# Altium footprint library 全库.PcbLib: 967 footprints (part 22 of 61)
Each footprint in its own frame and in the unit in brackets; x right, y up, seen from the top. Pads: shape width x height; smd on the part's side, far side on the other; paste and mask are expansions set on the pad; w line width, h text height; cw(c..) or ccw(c..) is an arc to the next point about the centre after c.
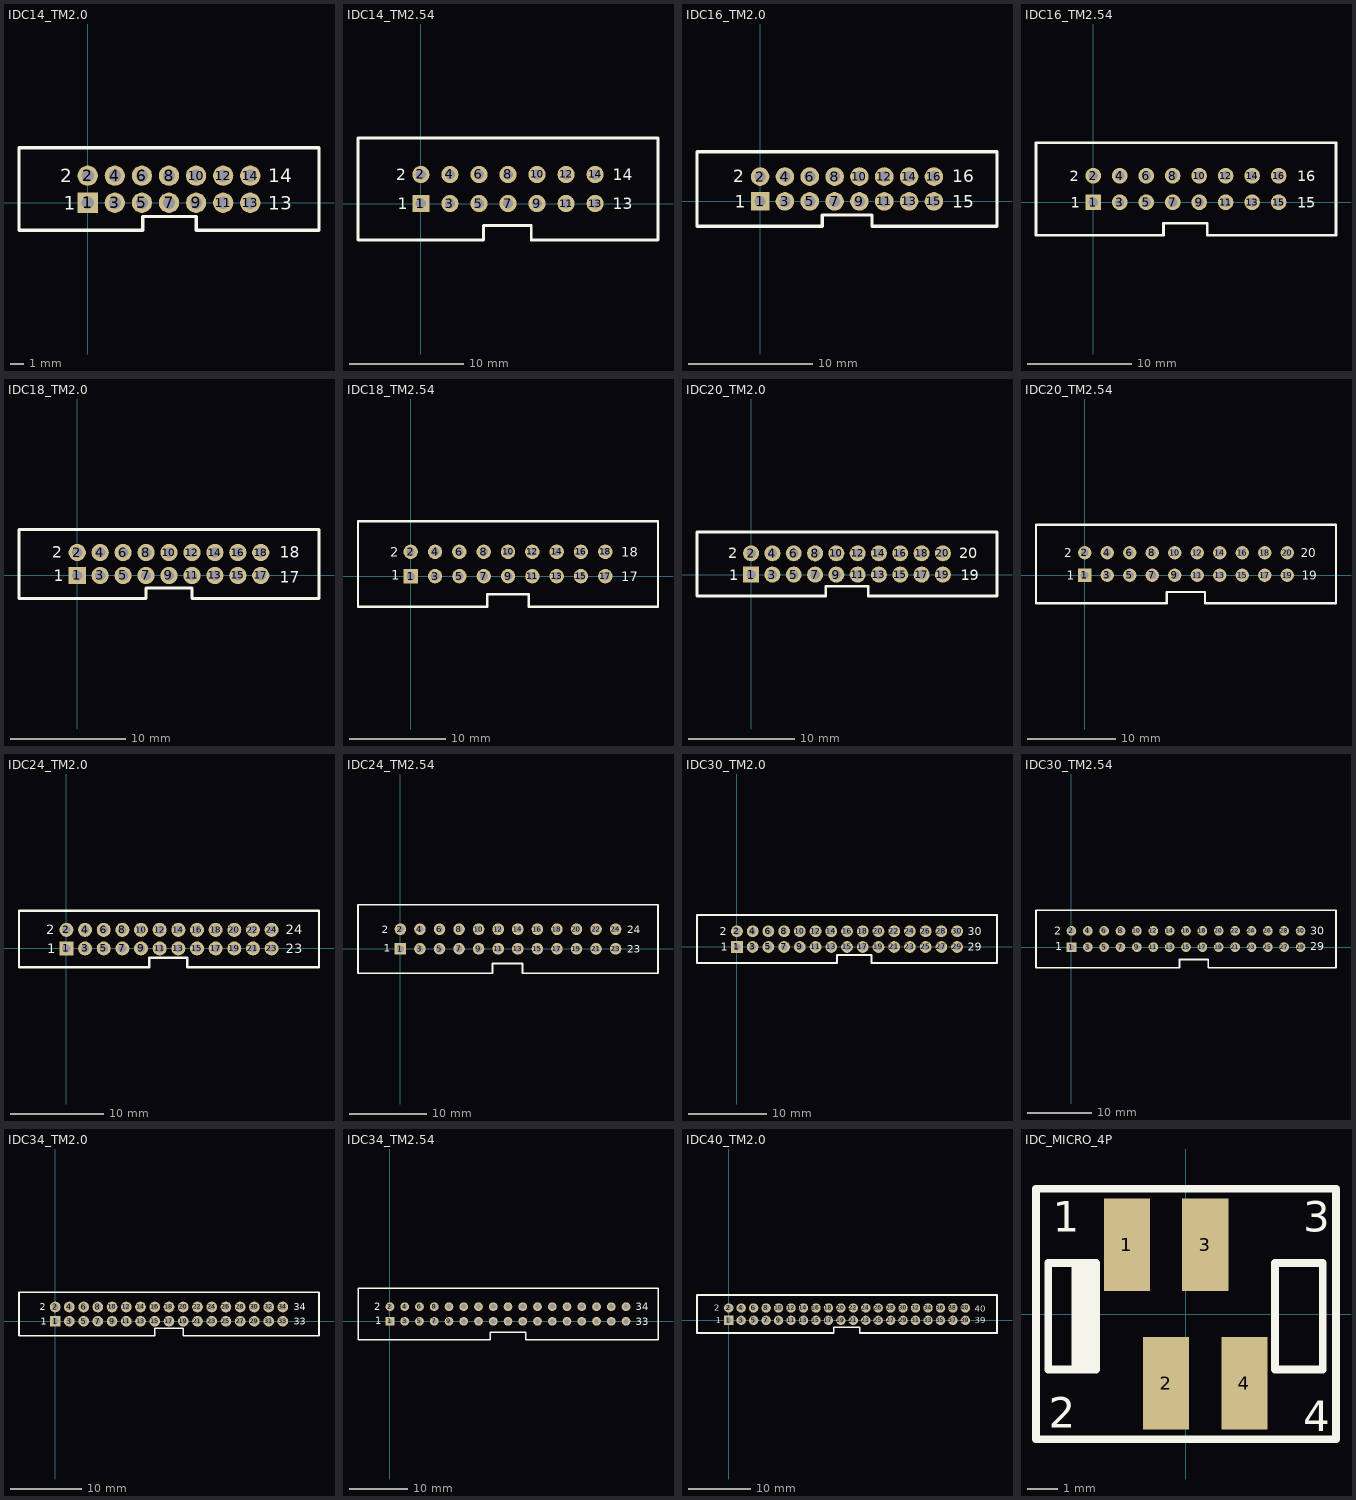
[diagram p21: the footprints below, top view; thin cyan lines are the x and y axes]

## IDC14_TM2.0 [mm]
pads (14):
  rect 1.5x1.5 hole 0.9: 1(0,0)
  round 1.5 hole 0.9: 2(0,2) 3(2,0) 4(2,2) 5(4,0) 6(4,2) 7(6,0) 8(6,2) 9(8,0) 10(8,2) 11(10,0) 12(10,2) 13(12,0) 14(12,2)
Top Overlay:
  lines w0.254: -5.08,-2.032 4.064,-2.032 4.064,-1.016 8.001,-1.016 8.001,-2.032 17.08,-2.032 17.08,4.064 -5.08,4.064 -5.08,-2.032
  text "1" at -1.778,-0.508 h1
  text "2" at -2.032,1.524 h1
  text "13" at 13.335,-0.508 h1
  text "14" at 13.335,1.524 h1

## IDC14_TM2.54 [mm] "Connector; Header; 7x2 Position"
pads (14):
  rect 1.5x1.5 hole 0.9: 1(0,0)
  round 1.5 hole 0.9: 2(0,2.54) 3(2.54,0) 4(2.54,2.54) 5(5.08,0) 6(5.08,2.54) 7(7.62,0) 8(7.62,2.54) 9(10.16,0) 10(10.16,2.54) 11(12.7,0) 12(12.7,2.54) 13(15.24,0) 14(15.24,2.54)
Top Overlay:
  lines w0.254: -5.5,-3.175 5.461,-3.175 5.461,-1.905 9.652,-1.905 9.652,-3.175 20.74,-3.175 20.74,5.715 -5.5,5.715 -5.5,-3.175
  text "1" at -2.032,-0.508 h1
  text "2" at -2.159,2.032 h1
  text "13" at 16.764,-0.508 h1
  text "14" at 16.764,2.032 h1

## IDC16_TM2.0 [mm]
pads (16):
  rect 1.5x1.5 hole 0.9: 1(0,0)
  round 1.5 hole 0.9: 2(0,2) 3(2,0) 4(2,2) 5(4,0) 6(4,2) 7(6,0) 8(6.006,1.997) 9(8,0) 10(8,2) 11(10,0) 12(10,2) 13(12,0) 14(12,2) 15(14,0) 16(14,2)
Top Overlay:
  lines w0.254: -5.08,-2.003 5.006,-2.003 5.006,-1.103 9.006,-1.103 9.006,-2.003 19.08,-2.003 19.08,3.997 -5.08,3.997 -5.08,-2.003
  text "1" at -2.032,-0.508 h1
  text "2" at -2.159,1.524 h1
  text "15" at 15.494,-0.508 h1
  text "16" at 15.494,1.524 h1

## IDC16_TM2.54 [mm]
pads (16):
  rect 1.5x1.5 hole 0.9: 1(0,0)
  round 1.5 hole 0.9: 2(-0.007,2.541) 3(2.54,0) 4(2.533,2.541) 5(5.08,0) 6(5.073,2.541) 7(7.62,0) 8(7.613,2.541) 9(10.153,0.001) 10(10.153,2.541) 11(12.693,0.001) 12(12.693,2.541) 13(15.233,0.001) 14(15.233,2.541) 15(17.773,0.001) 16(17.78,2.54)
Top Overlay:
  lines w0.254: -5.5,-3.175 -5.5,5.715 23.28,5.715 23.28,-3.175 10.922,-3.175 10.922,-2.032 6.731,-2.032 6.731,-3.175 -5.5,-3.175
  text "16" at 19.558,2.032 h1
  text "15" at 19.558,-0.508 h1
  text "2" at -2.286,2.032 h1
  text "1" at -2.159,-0.508 h1

## IDC18_TM2.0 [mm]
pads (18):
  rect 1.5x1.5 hole 0.9: 1(0,0)
  round 1.5 hole 0.9: 2(0,2) 3(2,0) 4(2,2) 5(4,0) 6(4,2) 7(6,0) 8(6.006,1.997) 9(8,0) 10(8,2) 11(10,0) 12(10,2) 13(12,0) 14(12,2) 15(14,0) 16(14,2) 17(16,0) 18(16,2)
Top Overlay:
  lines w0.254: -5.08,-2.003 6,-2.003 6,-1.103 10,-1.103 10,-2.003 21.08,-2.003 21.08,3.997 -5.08,3.997 -5.08,-2.003
  text "1" at -2.032,-0.508 h1
  text "2" at -2.159,1.524 h1
  text "18" at 17.653,1.524 h1
  text "17" at 17.653,-0.635 h1

## IDC18_TM2.54 [mm]
pads (18):
  rect 1.5x1.5 hole 0.9: 1(0,0)
  round 1.5 hole 0.9: 2(0,2.54) 3(2.54,0) 4(2.54,2.54) 5(5.087,-0.001) 6(5.08,2.54) 7(7.627,-0.001) 8(7.62,2.54) 9(10.167,-0.001) 10(10.16,2.54) 11(12.707,-0.001) 12(12.7,2.54) 13(15.24,0) 14(15.24,2.54) 15(17.78,0) 16(17.78,2.54) 17(20.32,0) 18(20.32,2.54)
Top Overlay:
  lines w0.254: -5.5,-3.175 8.001,-3.175 8.001,-1.905 12.319,-1.905 12.319,-3.175 25.82,-3.175 25.82,5.715 -5.5,5.715 -5.5,-3.175
  text "1" at -2.032,-0.381 h1
  text "2" at -2.159,2.032 h1
  text "18" at 21.971,2.032 h1
  text "17" at 21.971,-0.508 h1

## IDC20_TM2.0 [mm]
pads (20):
  rect 1.5x1.5 hole 0.9: 1(0,0)
  round 1.5 hole 0.9: 2(0,2) 3(2,0) 4(2,2) 5(4,0) 6(4,2) 7(6,0) 8(6.006,1.997) 9(8,0) 10(8,2) 11(10,0) 12(10,2) 13(12,0) 14(12,2) 15(14,0) 16(14,2) 17(16,0) 18(16,2) 19(18,0) 20(18,2)
Top Overlay:
  lines w0.254: 6.906,-2.003 -5.08,-2.003 -5.08,3.997 23.08,3.997 23.08,-2.003 11.006,-2.003 11.006,-1.103 7.006,-1.103 7.006,-2.003
  text "19" at 19.685,-0.508 h1
  text "20" at 19.558,1.524 h1
  text "2" at -2.159,1.524 h1
  text "1" at -2.032,-0.508 h1

## IDC20_TM2.54 [mm]
pads (20):
  rect 1.5x1.5 hole 0.9: 1(0,0)
  round 1.5 hole 0.9: 2(0,2.54) 3(2.54,0) 4(2.54,2.54) 5(5.087,-0.001) 6(5.08,2.54) 7(7.627,-0.001) 8(7.62,2.54) 9(10.167,-0.001) 10(10.16,2.54) 11(12.707,-0.001) 12(12.7,2.54) 13(15.24,0) 14(15.24,2.54) 15(17.78,0) 16(17.78,2.54) 17(20.32,0) 18(20.32,2.54) 19(22.86,0) 20(22.867,2.539)
Top Overlay:
  lines w0.254: -5.5,-3.175 9.271,-3.175 9.271,-1.905 13.589,-1.905 13.589,-3.175 28.367,-3.175 28.367,5.714 -5.5,5.714 -5.5,-3.175
  text "1" at -2.032,-0.508 h1
  text "2" at -2.286,2.032 h1
  text "20" at 24.384,2.032 h1
  text "19" at 24.511,-0.508 h1

## IDC24_TM2.0 [mm]
pads (24):
  rect 1.5x1.5 hole 0.9: 1(0,0)
  round 1.5 hole 0.9: 2(0,2) 3(2,0) 4(2,2) 5(4,0) 6(4,2) 7(6,0) 8(6,2) 9(8,0) 10(8,2) 11(10,0) 12(10,2) 13(12,0) 14(12,2) 15(14,0) 16(14,2) 17(16,0) 18(16,2) 19(18,0) 20(18,2) 21(20,0) 22(20,2) 23(22,0) 24(22,2)
Top Overlay:
  lines w0.254: -5.08,-2.032 -5.08,4.064 27.08,4.064 27.08,-2.032 12.954,-2.032 12.954,-0.992 8.89,-0.992 8.89,-2.032 -5.08,-2.032
  text "1" at -2.032,-0.508 h1
  text "2" at -2.159,1.524 h1
  text "23" at 23.495,-0.508 h1
  text "24" at 23.495,1.524 h1

## IDC24_TM2.54 [mm]
pads (24):
  rect 1.5x1.5 hole 0.9: 1(0,0)
  round 1.5 hole 0.9: 2(0,2.54) 3(2.54,0) 4(2.54,2.54) 5(5.08,0) 6(5.08,2.54) 7(7.62,0) 8(7.62,2.54) 9(10.16,0) 10(10.16,2.54) 11(12.7,0) 12(12.7,2.54) 13(15.24,0) 14(15.24,2.54) 15(17.78,0) 16(17.78,2.54) 17(20.32,0) 18(20.32,2.54) 19(22.86,0) 20(22.86,2.54) 21(25.4,0) 22(25.4,2.54) 23(27.94,0) 24(27.94,2.54)
Top Overlay:
  lines w0.254: -5.5,-3.175 11.938,-3.175 11.938,-1.905 15.875,-1.905 15.875,-3.175 33.44,-3.175 33.44,5.715 -5.5,5.715 -5.5,-3.175
  text "24" at 29.464,2.032 h1
  text "23" at 29.464,-0.508 h1
  text "2" at -2.413,2.032 h1
  text "1" at -2.159,-0.381 h1

## IDC30_TM2.0 [mm]
pads (30):
  rect 1.5x1.5 hole 0.9: 1(0,0)
  round 1.5 hole 0.9: 2(0,2) 3(2,0) 4(2,2) 5(4,0) 6(4,2) 7(6,0) 8(6,2) 9(8,0) 10(8,2) 11(10,0) 12(10,2) 13(12,0) 14(12,2) 15(14,0) 16(14,2) 17(16,0) 18(16,2) 19(18,0) 20(18,2) 21(20,0) 22(20,2) 23(22,0) 24(22,2) 25(24,0) 26(24,2) 27(26,0) 28(26,2) 29(28,0) 30(28,2)
Top Overlay:
  lines w0.254: -5.08,-2.032 12.7,-2.032 12.7,-0.992 17.145,-0.992 17.145,-2.032 33.08,-2.032 33.08,4.064 -5.08,4.064 -5.08,-2.032
  text "30" at 29.337,1.524 h1
  text "29" at 29.337,-0.508 h1
  text "2" at -2.159,1.524 h1
  text "1" at -2.032,-0.508 h1

## IDC30_TM2.54 [mm]
pads (30):
  rect 1.5x1.5 hole 0.9: 1(0,0)
  round 1.5 hole 0.9: 2(0,2.54) 3(2.54,0) 4(2.54,2.54) 5(5.08,0) 6(5.08,2.54) 7(7.62,0) 8(7.62,2.54) 9(10.16,0) 10(10.16,2.54) 11(12.7,0) 12(12.7,2.54) 13(15.24,0) 14(15.24,2.54) 15(17.78,0) 16(17.78,2.54) 17(20.32,0) 18(20.32,2.54) 19(22.86,0) 20(22.86,2.54) 21(25.4,0) 22(25.4,2.54) 23(27.94,0) 24(27.94,2.54) 25(30.48,0) 26(30.48,2.54) 27(33.02,0) 28(33.02,2.54) 29(35.56,0) 30(35.56,2.54)
Top Overlay:
  lines w0.254: -5.5,-3.175 16.764,-3.175 16.764,-1.905 21.209,-1.905 21.209,-3.175 41.06,-3.175 41.06,5.715 -5.5,5.715 -5.5,-3.175
  text "1" at -2.54,-0.508 h1.24
  text "2" at -2.667,1.905 h1.24
  text "29" at 37.084,-0.508 h1.24
  text "30" at 37.084,1.905 h1.24

## IDC34_TM2.0 [mm]
pads (34):
  rect 1.5x1.5 hole 0.9: 1(0,0)
  round 1.5 hole 0.9: 2(0,2) 3(2,0) 4(2,2) 5(4,0) 6(4,2) 7(6,0) 8(6,2) 9(8,0) 10(8,2) 11(10,0) 12(10,2) 13(12,0) 14(12,2) 15(14,0) 16(14,2) 17(16,0) 18(16,2) 19(18,0) 20(18,2) 21(20,0) 22(20,2) 23(22,0) 24(22,2) 25(24,0) 26(24,2) 27(26,0) 28(26,2) 29(28,0) 30(28,2) 31(30,0) 32(30,2) 33(32,0) 34(32,2)
Top Overlay:
  lines w0.254: -5.08,-2.032 13.991,-2.032 13.991,-0.992 17.991,-0.992 17.991,-2.032 37.08,-2.032 37.08,4.064 -5.08,4.064 -5.08,-2.032
  text "34" at 33.528,1.524 h1
  text "33" at 33.528,-0.508 h1
  text "2" at -2.159,1.524 h1
  text "1" at -2.032,-0.508 h1

## IDC34_TM2.54 [mm]
pads (34):
  rect 1.5x1.5 hole 0.9: 1(0,0)
  round 1.5 hole 0.9: 2(0,2.54) 3(2.54,0) 4(2.54,2.54) 5(5.08,0) 6(5.08,2.54) 7(7.62,0) 8(7.62,2.54) 9(10.16,0) 10(10.16,2.54) 11(12.7,0) 12(12.7,2.54) 13(15.24,0) 14(15.24,2.54) 15(17.78,0) 16(17.78,2.54) 17(20.32,0) 18(20.32,2.54) 19(22.86,0) 20(22.86,2.54) 21(25.4,0) 22(25.4,2.54) 23(27.94,0) 24(27.94,2.54) 25(30.48,0) 26(30.48,2.54) 27(33.02,0) 28(33.02,2.54) 29(35.56,0) 30(35.56,2.54) 31(38.1,0) 32(38.1,2.54) 33(40.64,0) 34(40.64,2.54)
Top Overlay:
  lines w0.254: -5.5,-3.175 17.272,-3.175 17.272,-1.905 23.368,-1.905 23.368,-3.175 46.14,-3.175 46.14,5.715 -5.5,5.715 -5.5,-3.175
  text "1" at -2.54,-0.508 h1.24
  text "2" at -2.667,1.905 h1.24
  text "33" at 42.291,-0.635 h1.24
  text "34" at 42.291,1.905 h1.24

## IDC40_TM2.0 [mm]
pads (40):
  rect 1.5x1.5 hole 0.9: 1(0,0)
  round 1.5 hole 0.9: 2(0,2) 3(2,0) 4(2,2) 5(4,0) 6(4,2) 7(6,0) 8(6,2) 9(8,0) 10(8,2) 11(10,0) 12(10,2) 13(12,0) 14(12,2) 15(14,0) 16(14,2) 17(16,0) 18(16,2) 19(18,0) 20(18,2) 21(20,0) 22(20,2) 23(22,0) 24(22,2) 25(24,0) 26(24,2) 27(26,0) 28(26,2) 29(28,0) 30(28,2) 31(30,0) 32(30,2) 33(32,0) 34(32,2) 35(34,0) 36(34,2) 37(36,0) 38(36,2) 39(38,0) 40(38,2)
Top Overlay:
  lines w0.254: -5.101,-2.024 -5.101,4.072 43.08,4.072 43.08,-2.024 21.061,-2.024 21.061,-1.135 16.87,-1.135 16.87,-2.024 -5.101,-2.024
  text "40" at 39.476,1.405 h1
  text "39" at 39.476,-0.5 h1
  text "2" at -2.307,1.532 h1
  text "1" at -2.053,-0.5 h1

## IDC_MICRO_4P [mm] "CA32-V-SMT Micro IDC"
pads (4):
  rect 1.5x3 smd: 1(-1.905,2.25) 2(-0.635,-2.25) 3(0.635,2.25) 4(1.905,-2.25)
Top Overlay:
  rectangle: -3.705,-1.799 -2.905,1.651
  lines w0.254: -4.855,-4.064 -4.855,4.064 4.875,4.064 4.875,-4.064 -4.855,-4.064 ; -4.455,-1.799 -4.455,1.651 -2.905,1.651 -2.905,-1.799 -4.455,-1.799 ; 2.895,-1.799 4.445,-1.799 4.445,1.651 2.895,1.651 2.895,-1.799
  text "1" at -4.318,2.667 h1
  text "2" at -4.445,-3.683 h1
  text "3" at 3.81,2.667 h1
  text "4" at 3.81,-3.81 h1